# Altium integrated library Integrated_Lib_060326.IntLib: 22 symbols
Pins are listed as number, name and electrical type; pins without a type are passive.

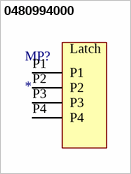
[diagram p0: symbol 0480994000]

## 0480994000
designator MP?
Connector Latch For PCI Express Mini Card; Manufacturer_Name: Molex; Manufacturer_Part_Number: 480994000; Package: None; Value: *; Digikey Link: https://www.digikey.com/en/products/detail/molex/0480994000/2405320?s=N4IgTCBcDaICwA4AMBOFcmZAXQL5A; Datasheet Link: https://mm.digikey.com/Volume0/opasdata/d220001/medias/docus/569/480994000_Dwg.pdf
footprint 0480994000
pins: P1, P2, P3, P4
text: Latch


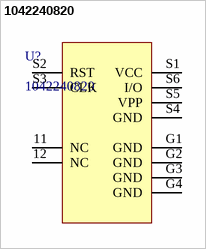
[diagram p1: symbol 1042240820]

## 1042240820
designator U?
nano-SIM Card Connector, 6 Circuit, Push/Pull Type, 1.11mm Height; Manufacturer_Name: Molex; Copyright: Copyright (C) 2026 Ultra Librarian. All rights reserved.; Manufacturer_Part_Number: 1042240820; Datasheet Link: https://www.molex.com/en-us/products/part-detail-pdf/1042240820?display=pdf; Package: None; Value: *
footprint 1042240820_MOL
pins: 11 NC, 12 NC, G1 GND (power), G2 GND (power), G3 GND (power), G4 GND (power), S1 VCC (power), S2 RST, S3 CLK, S4 GND (power), S5 VPP (power), S6 I/O


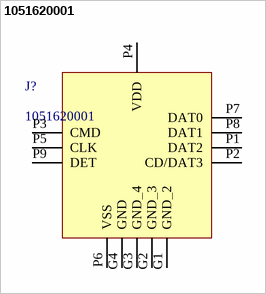
[diagram p2: symbol 1051620001]

## 1051620001
designator J?
9 (8 + 1) Position Card Connector Secure Digital - microSDâ„¢ Surface Mount, Right Angle Gold; Manufacturer: Molex; Mouser Price/Stock: https://www.mouser.com/ProductDetail/Molex/105162-0001?qs=1fNsfHe5VsK8daqlgKxZfQ%3D%3D&srsltid=AfmBOoqiBGepylU8kyj4HqlsNv8Qit_zjb4UlU_DB457MLPVBcP1mCRp; Package: None; Value: *; Manufacturer_Part_Number: 1051620001; Datasheet Link: https://www.molex.com/content/dam/molex/molex-dot-com/products/automated/en-us/salesdrawingpdf/105/105162/1051620001_sd.pdf?inline
footprint 105162-0001_MOL
pins: G1 GND_2 (power), G2 GND_3 (power), G3 GND_4 (power), G4 GND (power), P1 DAT2, P2 CD/DAT3, P3 CMD, P4 VDD (power), P5 CLK, P6 VSS, P7 DAT0, P8 DAT1, P9 DET


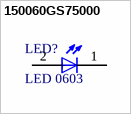
[diagram p3: symbol 150060GS75000]

## 150060GS75000
designator LED?, comment LED 0603
Single Colour LEDs WL-SMCW SMDMono TpVw Waterclr 0603 Green; Manufacturer_Part_Number: 150060GS75000; Manufacturer_Name: Wurth Elektronik; Datasheet Link: https://www.we-online.com/components/products/datasheet/150060GS75000.pdf; Package: 0603; Mouser Price/Stock: https://www.mouser.co.id/ProductDetail/Wurth-Elektronik/150060GS75000?qs=LlUlMxKIyB0UYkq5lDO8nA%3D%3D
footprint led0603 (Chip Diode, 2-Leads, Body 1,60x0,80mm, IPC Low Density)
pins: 1 Cathode, 2 Anode
text: +


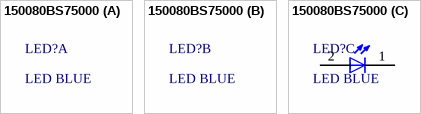
[diagram p4: symbol 150080BS75000]

## 150080BS75000
designator LED?, comment LED BLUE
Single Colour LEDs WL-SMCW SMDMono TpVw Waterclr 0805 Blue; Manufacturer_Name: Wurth Elektronik; Manufacturer_Part_Number: 150080BS75000; Datasheet Link: https://www.we-online.com/components/products/datasheet/150080BS75000.pdf; Mouser Price/Stock: https://www.mouser.co.id/ProductDetail/Wurth-Elektronik/150080BS75000?qs=2kOmHSv6VfT2tBo3UPVqAQ%3D%3D; Package: 0805
footprint LED0805 (Chip Diode, 2-Leads, Body 2,00x1,25mm, IPC Low Density)
part C pins: 1 Cathode, 2 Anode
part C text: +


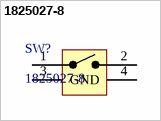
[diagram p5: symbol 1825027-8]

## 1825027-8
designator SW?
FSMRA3JH04=R/A,TACT PB SW,160G; Manufacturer_Name: TE Connectivity; Copyright: Copyright (C) 2026 Ultra Librarian. All rights reserved.; Manufacturer_Part_Number: 1825027-8; Datasheet Link: https://www.te.com/commerce/DocumentDelivery/DDEController?Action=srchrtrv&DocNm=1825027&DocType=Customer%20Drawing&DocLang=English&DocFormat=pdf&PartCntxt=1825027-8; Package: None
footprint SW2_1825027-C_TEC
pins: 1, 2, 3 GND, 4 GND


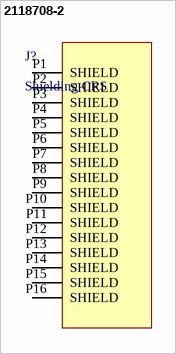
[diagram p6: symbol 2118708-2]

## 2118708-2
designator J?, comment Shielding CRS
EMI Gaskets, Sheets, Absorbers & Shielding CRS, 26.21mmx26.21mm Standard Shield; Manufacture_Name: TE Connectivity; Manufacture_Part_Number: 2118708-2; Package: None; Mouser Price/Stock: https://www.mouser.com/ProductDetail/TE-Connectivity-Alcoswitch/2118708-2?qs=u4fy%2FsgLU9Oo%252BT5sG5RvxQ%3D%3D; Value: *; Datasheet Link: *
footprint TE_2118708-2
pins: P1 SHIELD, P2 SHIELD "Mechanical Pads", P3 SHIELD "Mechanical Pads", P4 SHIELD "Mechanical Pads", P5 SHIELD "Mechanical Pads", P6 SHIELD "Mechanical Pads", P7 SHIELD "Mechanical Pads", P8 SHIELD "Mechanical Pads", P9 SHIELD "Mechanical Pads", P10 SHIELD "Mechanical Pads", P11 SHIELD "Mechanical Pads", P12 SHIELD "Mechanical Pads", P13 SHIELD "Mechanical Pads", P14 SHIELD "Mechanical Pads", P15 SHIELD "Mechanical Pads", P16 SHIELD "Mechanical Pads"


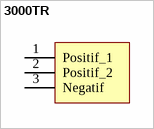
[diagram p7: symbol 3000TR]

## 3000TR
designator J?  (value not drawn)
Battery Retainer Coin, 12.0mm 1 Cell SMD (SMT) Tab; Manufacturer_Name: Keystone Electronics; Manufacturer_Part_Number: 3000TR; Value: *; Mouser Price/Stock: https://www.mouser.co.uk/ProductDetail/Keystone-Electronics/3000TR?qs=811De8TLL%252BeRUCmGL5ZsKg%3D%3D; Datasheet Link: https://www.keyelco.com/produchttps://www.mouser.co.za/datasheet/2/215/3000TR-742873.pdft-pdf.cfm?p=777; Package: None
footprint 3000TR
pins: 1 Positif_1, 2 Positif_2, 3 Negatif


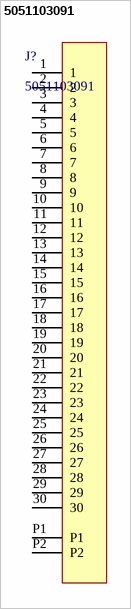
[diagram p8: symbol 5051103091]

## 5051103091
designator J?
Easy-On FFC/FPC Connector 0.50mm Pitch, FD19 Series, Right-Angle, Bottom  Contact, 1.90mm Height, 30 Circuits, Gold over Nickel Plating; Manufacturer_Name: Molex; Copyright: Copyright (C) 2026 Ultra Librarian. All rights reserved.; Manufacturer_Part_Number: 5051103091; Datasheet Link: https://www.molex.com/en-us/products/part-detail-pdf/5051103091?display=pdf; Mouser Price/Stock: https://www.mouser.com/ProductDetail/Molex/505110-3091?qs=fSIr1QPo%2F%2FSZ9fkf9Qvqqg%3D%3D; Package: None
footprint CON_5051103091_MOL
pins: 1, 2, 3, 4, 5, 6, 7, 8, 9, 10, 11, 12, 13, 14, 15, 16, 17, 18, 19, 20, 21, 22, 23, 24, 25, 26, 27, 28, 29, 30, P1, P2


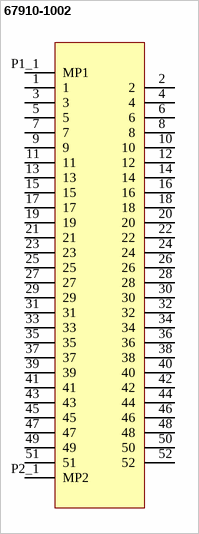
[diagram p9: symbol 67910-1002]

## 67910-1002
designator J?  (value not drawn)
52 Position Female Connector PCI Express Mini Card Gold 0.031" (0.80mm) Black; Manufacturer_Name: Molex; Manufacturer_Part_Number: 67910-1002; Package: None; Mouser Price/Stock: https://www.mouser.co.uk/ProductDetail/Molex/67910-1002?qs=9lGuLzn8aqdn7mBRyB4Cgg%3D%3D; Datasheet Link: https://www.molex.com/content/dam/molex/molex-dot-com/products/automated/en-us/salesdrawingpdf/679/67910/679101002_sd.pdf?inline
footprint 679101002
pins: 1, 2, 3, 4, 5, 6, 7, 8, 9, 10, 11, 12, 13, 14, 15, 16, 17, 18, 19, 20, 21, 22, 23, 24, 25, 26, 27, 28, 29, 30, 31, 32, 33, 34, 35, 36, 37, 38, 39, 40, 41, 42, 43, 44, 45, 46, 47, 48, 49, 50, 51, 52, P1_1 MP1, P2_1 MP2


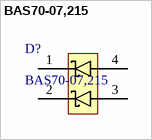
[diagram p10: symbol BAS70-07,215]

## BAS70-07,215
designator D?
Schottky Diodes & Rectifiers BAS70-07/SOT143/SOT4; Manufacturer_Name: Nexperia USA; Datasheet Link: https://assets.nexperia.com/documents/data-sheet/BAS70-07.pdf; Package: SOT143B-4 Nexperia USA Inc.; Manufacturer_Part_Number: BAS70-07,215; Mouser Price/Stock: https://www.mouser.co.id/ProductDetail/Nexperia/BAS70-07215?qs=me8TqzrmIYVtbWeTaWFP7A%3D%3D; Value: *
footprint SOT190P237X110-4N (SOT143, 4-Leads, Body 2,90x2,37mm, Pitch 1,90mm, IPC Medium Density)
pins: 1 K, 2 K, 3 A, 4 A


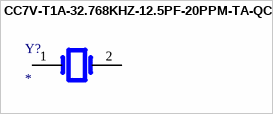
[diagram p11: symbol CC7V-T1A-32.768KHZ-12.5PF-20PPM-TA-QC]

## CC7V-T1A-32.768KHZ-12.5PF-20PPM-TA-QC
designator Y?
LOW FREQUENCY CRYSTAL; MF: Micro Crystal; MP: CC7V-T1A-32.768kHz-12.5pF-20PPM-TA-QC; SnapEDA_Link: https://www.snapeda.com/parts/CC7V-T1A-32.768kHz-12.5pF-20PPM-TA-QC/Micro+Crystal/view-part/?ref=snap; Package: SMD-2 Micro Crystal; Value: *; Check_prices: https://www.snapeda.com/parts/CC7V-T1A-32.768kHz-12.5pF-20PPM-TA-QC/Micro+Crystal/view-part/?ref=eda
footprint CC7V-T1A-32.768KHZ-12.5PF-20PPM-TA-QC (32.768 kHz ±20ppm Crystal 12.5pF 70 kOhms 2-SMD, No Lead)
pins: 1, 2


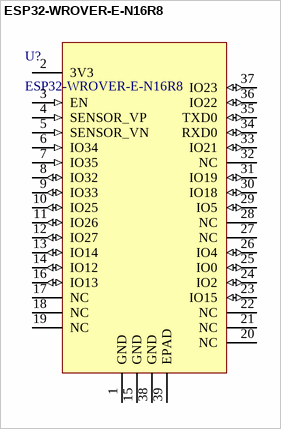
[diagram p12: symbol ESP32-WROVER-E-N16R8]

## ESP32-WROVER-E-N16R8
designator U?
Bluetooth, WiFi 802.11b/g/n, Bluetooth v4.2 +EDR Transceiver Module 2.4GHz ~ 2.5GHz PCB Trace Surface Mount; Manufacturer_Name: Espressif Systems; Type: RF Transceiver Modules and Modems; Datasheet Link: https://documentation.espressif.com/esp32-wrover-e_esp32-wrover-ie_datasheet_en.pdf; Manufacturer_Part_Number: ESP32-WROVER-E-N16R8; Package: None; Mouser Price/Stock: https://www.mouser.co.id/ProductDetail/Espressif-Systems/ESP32-WROVER-E-N16R8?qs=Li%252BoUPsLEnsfUZ%252By2eNF6g%3D%3D
footprint ESP32-WROVER-E_EXP
pins: 1 GND (power), 2 3V3 (power), 3 EN (in), 4 SENSOR_VP (in), 5 SENSOR_VN (in), 6 IO34 (in), 7 IO35 (in), 8 IO32 (io), 9 IO33 (io), 10 IO25 (io), 11 IO26 (io), 12 IO27 (io), 13 IO14 (io), 14 IO12 (io), 15 GND (power), 16 IO13 (io), 17 NC, 18 NC, 19 NC, 20 NC, 21 NC, 22 NC, 23 IO15 (io), 24 IO2 (io), 25 IO0 (io), 26 IO4 (io), 27 NC, 28 NC, 29 IO5 (io), 30 IO18 (io), 31 IO19 (io), 32 NC, 33 IO21 (io), 34 RXD0 (io), 35 TXD0 (io), 36 IO22 (io), 37 IO23 (io), 38 GND (power), 39 EPAD (power)


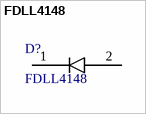
[diagram p13: symbol FDLL4148]

## FDLL4148
designator D?
Diode Standard 100 V 200mA Surface Mount SOD-80; Manufacturer_Name: ON Semiconductor; Mouser Price/Stock: https://www.mouser.co.id/ProductDetail/onsemi/FDLL4148?qs=GXJjH%252BIVz3Nb7%252BJnJig0Zw%3D%3D; Package: SOD-80-2 ON Semiconductor; Value: *; Manufacturer_Part_Number: FDLL4148; Datasheet Link: https://www.onsemi.com/download/data-sheet/pdf/1n914-d.pdf
footprint DIOMELF3414N (MELF Diode, 2-Leads, Body 3,40x1,40mm, IPC Medium Density)
pins: 1 C, 2 A


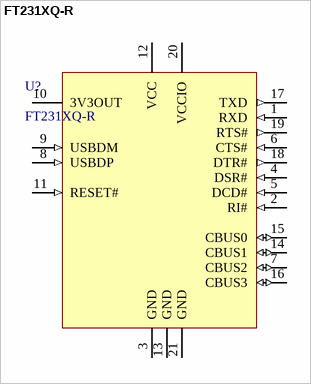
[diagram p14: symbol FT231XQ-R]

## FT231XQ-R
designator U?
No Description Available; Manufacturer_Name: FTDI, Future Technology Devices International Ltd; Manufacturer_Part_Number: FT231XQ-R; Mouser Price/Stock: https://www.mouser.co.id/ProductDetail/FTDI/FT231XQ-R?qs=Gp1Yz1mis3VkAf3iW%252BkumQ%3D%3D; Datasheet Link: https://www.ftdichip.com/Support/Documents/DataSheets/ICs/DS_FT231X.pdf
footprint QFN50P400X400X80_HS-21L (QFN, 20-Leads, Body 4,00x4,00mm, Pitch 0,50mm, Thermal Pad 1,98x1,98mm, IPC High Density)
pins: 1 RXD (in), 2 RI# (in), 3 GND (power), 4 DSR# (in), 5 DCD# (in), 6 CTS# (in), 7 CBUS2 (io), 8 USBDP (in), 9 USBDM (in), 10 3V3OUT (power), 11 RESET# (in), 12 VCC (power), 13 GND (power), 14 CBUS1 (io), 15 CBUS0 (io), 16 CBUS3 (io), 17 TXD (out), 18 DTR# (out), 19 RTS# (out), 20 VCCIO (power), 21 GND (power)


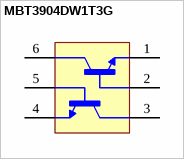
[diagram p15: symbol MBT3904DW1T3G]

## MBT3904DW1T3G
designator Q?  (value not drawn)
Simplifies Circuit Design; Reduces Component Count; Available in 8 mm, 7-inch/3,000 Unit Tape and Reel; hFE, 100-300; Reduces Board Space; S and NSV Prefix for Automotive and Other Applications Requiring Unique Site and Control Change Requirements; AEC-Q101 Qualified and PPAP Capable; These Devices are Pb-Free, Halogen Free/BFR Free and are RoHS CompliantCapable; Manufacturer_Name: onsemi; Geometry.Height: 1.1mm; Manufacturer_Part_Number: MBT3904DW1T3G; Mouser Part Number: 863-MBT3904DW1T3G; Mouser Price/Stock: https://www.mouser.co.uk/ProductDetail/onsemi/MBT3904DW1T3G?qs=3JMERSakebqWY43nSm9tRw%3D%3D; Datasheet Link: https://www.onsemi.com/pub/Collateral/MBT3904DW1T1-D.PDF
footprint SOT65P210X110-6N
pins: 1 E2, 2 B2, 3 C1, 4 E1, 5 B1, 6 C2


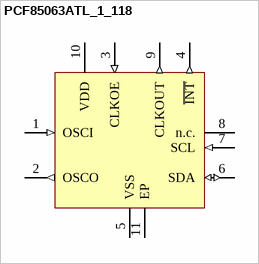
[diagram p16: symbol PCF85063ATL_1_118]

## PCF85063ATL_1_118
designator B?  (value not drawn)
NXP - PCF85063ATL/1,118 - REAL TIME CLOCK/CALENDAR, BINARY, HXSON; Geometry.Height: 0.5mm; Manufacturer_Name: NXP; Manufacturer_Part_Number: PCF85063ATL/1,118; Mouser Part Number: 771-PCF85063ATL1118; Mouser Price/Stock: https://www.mouser.co.uk/ProductDetail/NXP-Semiconductors/PCF85063ATL-1118?qs=fi7yB2oewZkLUjzuQ0vPOQ%3D%3D; Datasheet Link: http://www.nxp.com/docs/en/data-sheet/PCF85063A.pdf
footprint SON50P260X50_HS-11L (SON, 10-Leads, Body 2,60x2,60mm, Pitch 0,50mm, Thermal Pad 2,15x1,25mm, IPC High Density)
pins: 1 OSCI (in), 2 OSCO (out), 3 CLKOE (in), 4 ~{INT} (out), 5 VSS (power), 6 SDA (io), 7 SCL (in), 8 n.c., 9 CLKOUT (out), 10 VDD (power), 11 EP


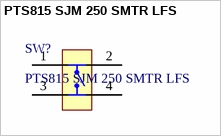
[diagram p17: symbol PTS815 SJM 250 SMTR LFS]

## PTS815 SJM 250 SMTR LFS
designator SW?
Tactile Switch SPST-NO Top Actuated Surface Mount; Manufacturer_Name: C&K Components; Copyright: Copyright (C) 2026 Ultra Librarian. All rights reserved.; Manufacturer_Part_Number: PTS815 SJM 250 SMTR LFS; RefDes: RefDes; Type: Type
footprint SW4_PTS815 SJM 250 SMTR LFS_CNK
pins: 1, 2, 3, 4


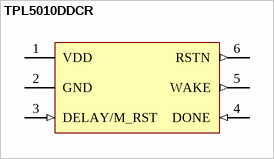
[diagram p18: symbol TPL5010DDCR]

## TPL5010DDCR
designator U?  (value not drawn)
Ultra Low Power Timer with Watchdog functionality and Manual Reset; Manufacturer_Name: Texas Instruments; Geometry.Height: 1.1mm; Manufacturer_Part_Number: TPL5010DDCR; Mouser Part Number: 595-TPL5010DDCR; Mouser Price/Stock: https://www.mouser.co.uk/ProductDetail/Texas-Instruments/TPL5010DDCR?qs=beZBGHSk9c1Q%2FTwsXVPVNQ%3D%3D; Datasheet Link: http://www.ti.com/lit/gpn/tpl5010
footprint SOT95P280X110-6N
pins: 1 VDD (power), 2 GND (power), 3 DELAY/M_RST (in), 4 DONE (in), 5 WAKE (out), 6 RSTN (out)


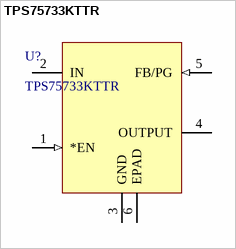
[diagram p19: symbol TPS75733KTTR]

## TPS75733KTTR
designator U?
3-A, ultra-low-dropout voltage regulator with power good & enable 5-DDPAK/TO-263 -40 to 125; Manufacturer_Name: Texas Instruments; Manufacturer_Part_Number: TPS75733KTTR; Mouser Price/Stock: https://www.mouser.co.id/ProductDetail/Texas-Instruments/TPS75733KTTR?qs=6zVL%252ByCp0moEuJaoMQnBuw%3D%3D; Datasheet Link: https://www.ti.com/lit/gpn/tps757
footprint DPAK170P1524X483-6N (D2-PAK, 6-Pads, Body 7,93x8,70mm (max), IPC Medium Density)
pins: 1 *EN (in), 2 IN (power), 3 GND (power), 4 OUTPUT (power), 5 FB/PG (in), 6 EPAD


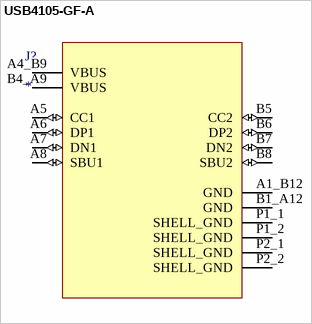
[diagram p20: symbol USB4105-GF-A]

## USB4105-GF-A
designator J?
Manufacturer_Name: GCT; Manufacturer_Part_Number: USB4105-GF-A; Package: None; Mouser Price/Stock: https://www.mouser.co.id/ProductDetail/GCT/USB4105-GF-A?qs=KUoIvG%2F9IlY%2FMLlBMpStpA%3D%3D; Value: *; Datasheet Link: https://www.mouser.com/catalog/specsheets/Global_Connector_Technology_usb4105.pdf?_gl=1*10mmgcf*_gcl_au*MTQyMDE2NzMxOC4xNzcyNzU2ODM5LjE1NjI2MTUwMC4xNzcyOTY0NjE4LjE3NzI5NjQ2MTc.*_ga*MzY4MzU3OTA3LjE3NzI3NTY4NDA.*_ga_15W4STQT4T*czE3NzI5NjM5MzkkbzUkZzEkdDE3NzI5NjUxODQkajU4JGwwJGgw
footprint GCT_USB4105-GF-A
pins: A1_B12 GND (power), A4_B9 VBUS (power), A5 CC1 (io), A6 DP1 (io), A7 DN1 (io), A8 SBU1 (io), B1_A12 GND (power), B4_A9 VBUS (power), B5 CC2 (io), B6 DP2 (io), B7 DN2 (io), B8 SBU2 (io), P1_1 SHELL_GND (power), P1_2 SHELL_GND (power), P2_1 SHELL_GND (power), P2_2 SHELL_GND (power)


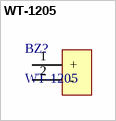
[diagram p21: symbol WT-1205]

## WT-1205
designator BZ?
dengan deskripsi seperti ini Buzzers Transducer, Externally Driven Magnetic 5 V 50mA 2.4kHz 87dB @ 5V, 10cm Through Hole PC Pins apakah sudah pasti buzzer ?; Manufacturer_Name: Soberton Inc.; Manufacturer_Part_Number: WT-1205; Digikey Link: https://www.digikey.com/en/products/detail/soberton-inc/WT-1205/479674; Datasheet Link: https://www.soberton.com/wp-content/uploads/2019/02/WT-1205-16-Feb-2019.pdf
footprint WT-1205 (Buzzers Transducer, Externally Driven Magnetic 5 V 50mA 2.4kHz 87dB @ 5V, 10cm Through Hole PC Pins)
pins: 1 +, 2 -